# Altium footprint library ACTION标准库.pcblib: 504 footprints (part 25 of 32)
Each footprint in its own frame and in the unit in brackets; x right, y up, seen from the top. Pads: shape width x height; smd on the part's side, far side on the other; paste and mask are expansions set on the pad; w line width, h text height; cw(c..) or ccw(c..) is an arc to the next point about the centre after c.
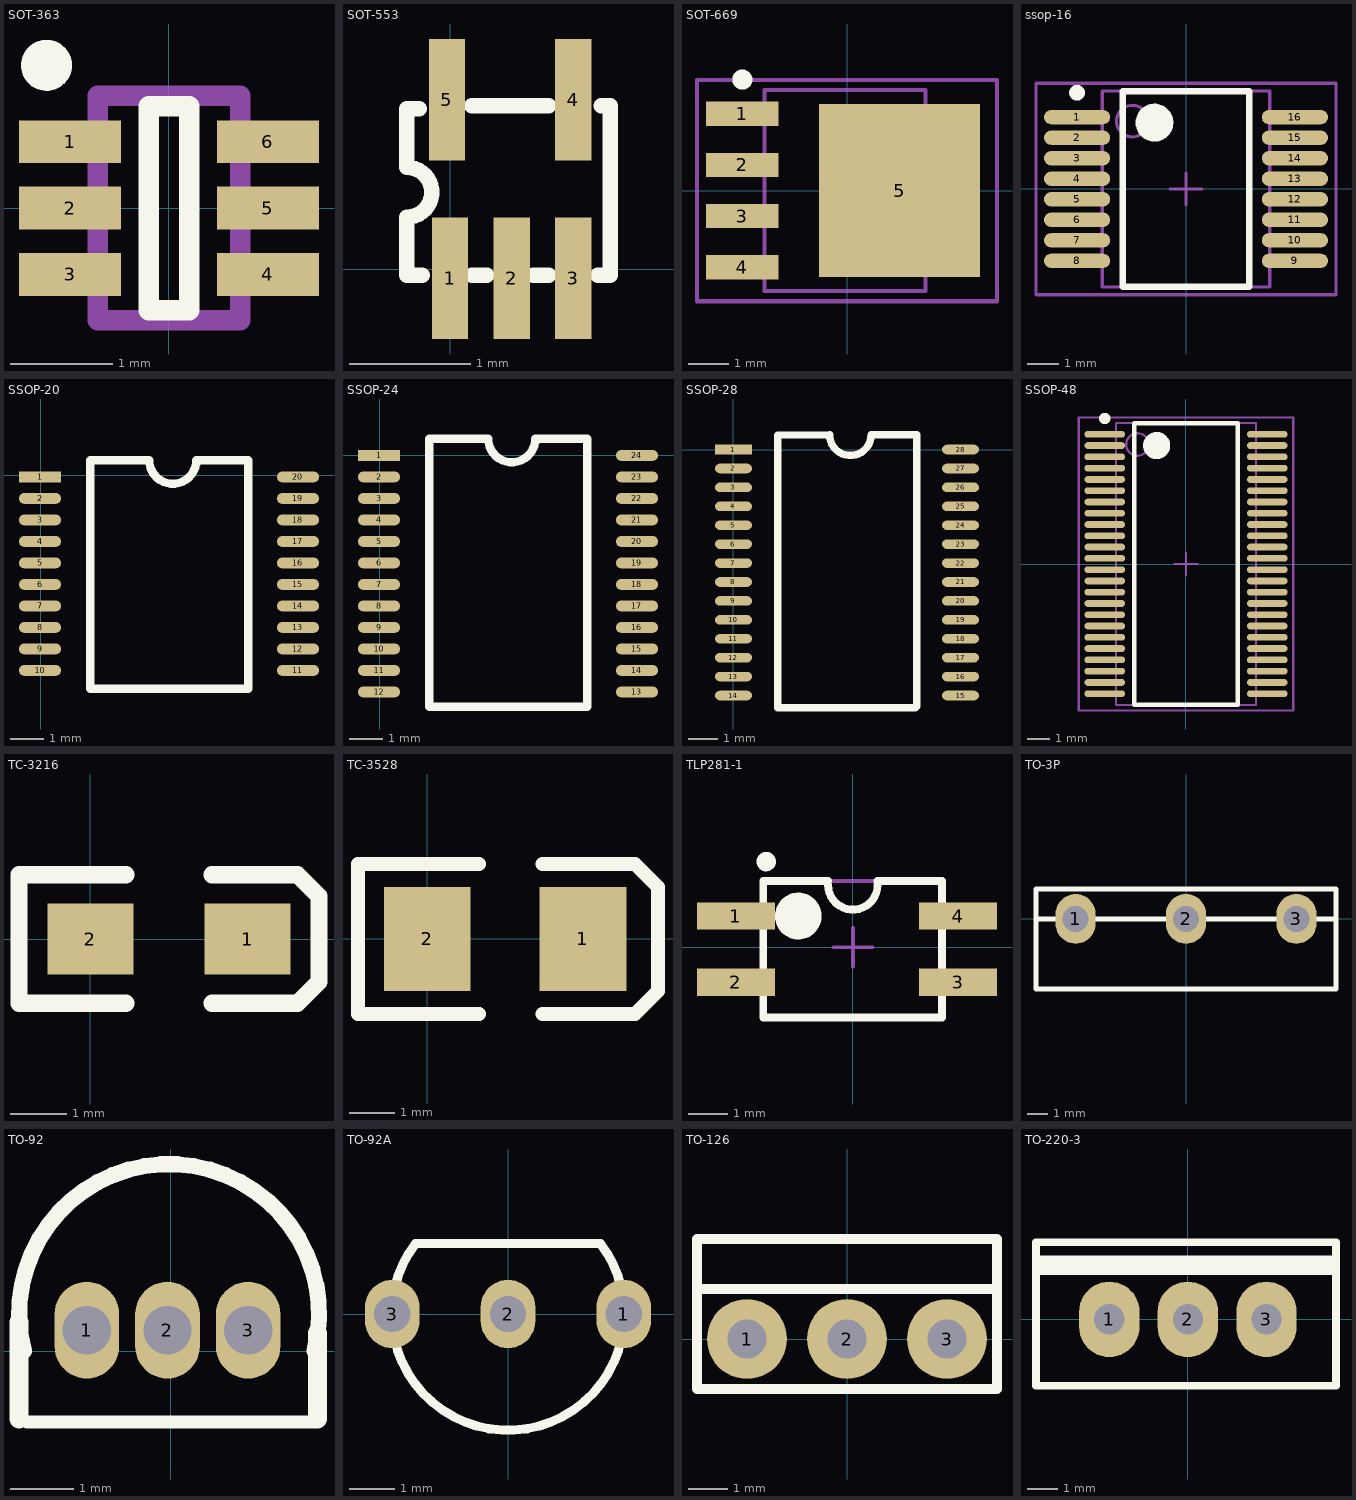
[diagram p24: the footprints below, top view; thin cyan lines are the x and y axes]

## SOT-363 [mm]
pads (6):
  rect 1x0.42 smd mask+0.051: 1(-0.97,0.65) 2(-0.97,0) 3(-0.97,-0.65) 4(0.97,-0.65) 5(0.97,0) 6(0.97,0.65)
Top Overlay:
  circle w0.25: c-1.2,1.4 r0.125
  lines w0.2: -0.2,-1 0.2,-1 0.2,1 -0.2,1 -0.2,-1
Mechanical 13:
  lines w0.2: -0.7,-1.1 -0.7,1.1 0.7,1.1 0.7,-1.1 -0.7,-1.1
3D body "User Library-SOT363-2.STEP": height 1.1, standoff 0, extent -1.2,-1.1 1.2,1.1

## SOT-553 [mm]
pads (5):
  rect 0.3x1 smd: 1(0,-0.076) 2(0.508,-0.076) 3(1.016,-0.076) 4(1.016,1.397) 5(-0.025,1.397)
Top Overlay:
  lines w0.127: -0.254,1.321 -0.356,1.321 -0.356,0.838 cw(c-0.356,0.633) -0.356,0.429 -0.356,-0.051 -0.229,-0.051 ; 0.178,-0.051 0.305,-0.051 ; 0.178,1.346 0.813,1.346 ; 0.686,-0.051 0.813,-0.051 ; 1.219,-0.051 1.321,-0.051 1.321,1.346 1.245,1.346
3D body "User Library-sot-553.STEP": height 0.48, standoff -0.02, extent -0.279,-0.013 1.321,1.587

## SOT-669 [mm] "TO, 5-Pads, Body 4.0x5.0mm (max), IPC Medium Density"
height 1
pads (5):
  rect 1.8x0.6 smd: 1(-2.6,1.905) 2(-2.6,0.635) 3(-2.6,-0.635) 4(-2.6,-1.905)
  rect 4x4.3 smd: 5(1.306,0)
Top Overlay:
  circle w0.25: c-2.6,2.755 r0.125
Mechanical 13:
  lines w0.1: -2.05,-2.5 1.95,-2.5 1.95,2.5 -2.05,2.5 -2.05,-2.5
Mechanical 15:
  lines w0.1: -0.5,0 0.5,0 ; 0,-0.5 0,0.5 ; -3.725,-2.75 3.725,-2.75 3.725,2.75 -3.725,2.75 -3.725,-2.75
3D body "User Library-SOT669.STEP": height 1.2, standoff 0, extent -3.214,-2.475 3.553,2.525

## ssop-16 [mm] "SOP, 16-Leads, Body 6.2x5.3mm (max), Pitch 0.65mm, IPC Medium Density"
height 1.86
pads (16):
  oval 2.1x0.45 smd: 1(-3.45,2.275) 2(-3.45,1.625) 3(-3.45,0.975) 4(-3.45,0.325) 5(-3.45,-0.325) 6(-3.45,-0.975) 7(-3.45,-1.625) 8(-3.45,-2.275) 9(3.45,-2.275) 10(3.45,-1.625) 11(3.45,-0.975) 12(3.45,-0.325) 13(3.45,0.325) 14(3.45,0.975) 15(3.45,1.625) 16(3.45,2.275)
Top Overlay:
  circle w0.6: c-1,2.1 r0.3
  circle w0.25: c-3.45,3.05 r0.125
  lines w0.2: -2,-3.1 2,-3.1 2,3.1 -2,3.1 -2,-3.1
Mechanical 13:
  circle w0.1: c-1.7,2.15 r0.5
  lines w0.1: -2.65,-3.1 2.65,-3.1 2.65,3.1 -2.65,3.1 -2.65,-3.1
Mechanical 15:
  lines w0.1: -0.5,0 0.5,0 ; 0,-0.5 0,0.5 ; -4.75,-3.35 4.75,-3.35 4.75,3.35 -4.75,3.35 -4.75,-3.35
3D body "SSOP-16.STEP": height 1.13, standoff 0.03, extent -2.972,-2.489 3.023,2.489

## SSOP-20 [mm]
pads (20):
  rect 1.27x0.33 smd: 1(-0.025,-0.051)
  oval 1.27x0.33 smd: 2(-0.025,-0.701) 3(-0.025,-1.351) 4(-0.025,-2.001) 5(-0.025,-2.651) 6(-0.025,-3.301) 7(-0.025,-3.951) 8(-0.025,-4.601) 9(-0.025,-5.251) 10(-0.025,-5.901) 11(7.775,-5.901) 12(7.775,-5.251) 13(7.775,-4.601) 14(7.775,-3.951) 15(7.775,-3.301) 16(7.775,-2.651) 17(7.775,-2.001) 18(7.775,-1.351) 19(7.775,-0.701) 20(7.775,-0.051)
Top Overlay:
  lines w0.254: 6.223,-6.45 1.499,-6.45 1.499,0.449 3.269,0.449 3.277,0.457 ccw(c3.99,0.457) 4.703,0.457 6.266,0.457 6.274,0.449 6.274,-6.45
3D body "SSOP-20.STEP": height 2.04, standoff 0.05, extent -0.013,-6.637 7.887,0.693

## SSOP-24 [mm]
pads (24):
  rect 1.27x0.33 smd: 1(-0.025,0)
  oval 1.27x0.33 smd: 2(-0.025,-0.65) 3(-0.025,-1.3) 4(-0.025,-1.95) 5(-0.025,-2.6) 6(-0.025,-3.25) 7(-0.025,-3.9) 8(-0.025,-4.55) 9(-0.025,-5.2) 10(-0.025,-5.85) 11(-0.025,-6.5) 12(-0.025,-7.15) 13(7.775,-7.15) 14(7.775,-6.5) 15(7.775,-5.85) 16(7.775,-5.2) 17(7.775,-4.55) 18(7.775,-3.9) 19(7.775,-3.25) 20(7.775,-2.6) 21(7.775,-1.95) 22(7.775,-1.3) 23(7.775,-0.65) 24(7.775,0)
Top Overlay:
  lines w0.254: 6.223,-7.6 1.499,-7.6 1.499,0.5 3.269,0.5 3.277,0.508 ccw(c3.99,0.508) 4.703,0.508 6.266,0.508 6.274,0.5 6.274,-7.6
3D body "User Library-SSOP-24.STEP": height 1.9, standoff 0, extent -0.141,-7.758 7.659,0.442

## SSOP-28 [mm]
pads (28):
  rect 1.27x0.33 smd: 1(0,0)
  oval 1.27x0.33 smd: 2(0,-0.65) 3(0,-1.3) 4(0,-1.95) 5(0,-2.6) 6(0,-3.25) 7(0,-3.9) 8(0,-4.55) 9(0,-5.2) 10(0,-5.85) 11(0,-6.5) 12(0,-7.15) 13(0,-7.8) 14(0,-8.45) 15(7.8,-8.45) 16(7.8,-7.8) 17(7.8,-7.15) 18(7.8,-6.5) 19(7.8,-5.85) 20(7.8,-5.2) 21(7.8,-4.55) 22(7.8,-3.9) 23(7.8,-3.25) 24(7.8,-2.6) 25(7.8,-1.95) 26(7.8,-1.3) 27(7.8,-0.65) 28(7.8,0)
Top Overlay:
  lines w0.254: 1.524,-8.865 1.524,0.5 3.294,0.5 3.302,0.508 ccw(c4.015,0.508) 4.728,0.508 6.291,0.508 6.299,0.5 6.299,-8.814 6.248,-8.865 1.524,-8.865
3D body "User Library-SSOP-28-3.STEP": height 1.9, standoff 0, extent 0.062,-9.342 7.862,0.858

## SSOP-48 [mm]
pads (48):
  oval 1.8x0.3 smd: 1(-3.6,5.75) 2(-3.6,5.25) 3(-3.6,4.75) 4(-3.6,4.25) 5(-3.6,3.75) 6(-3.6,3.25) 7(-3.6,2.75) 8(-3.6,2.25) 9(-3.6,1.75) 10(-3.6,1.25) 11(-3.6,0.75) 12(-3.6,0.25) 13(-3.6,-0.25) 14(-3.6,-0.75) 15(-3.6,-1.25) 16(-3.6,-1.75) 17(-3.6,-2.25) 18(-3.6,-2.75) 19(-3.6,-3.25) 20(-3.6,-3.75) 21(-3.6,-4.25) 22(-3.6,-4.75) 23(-3.6,-5.25) 24(-3.6,-5.75) 25(3.6,-5.75) 26(3.6,-5.25) 27(3.6,-4.75) 28(3.6,-4.25) 29(3.6,-3.75) 30(3.6,-3.25) 31(3.6,-2.75) 32(3.6,-2.25) 33(3.6,-1.75) 34(3.6,-1.25) 35(3.6,-0.75) 36(3.6,-0.25) 37(3.6,0.25) 38(3.6,0.75) 39(3.6,1.25) 40(3.6,1.75) 41(3.6,2.25) 42(3.6,2.75) 43(3.6,3.25) 44(3.6,3.75) 45(3.6,4.25) 46(3.6,4.75) 47(3.6,5.25) 48(3.6,5.75)
Top Overlay:
  circle w0.6: c-1.3,5.25 r0.3
  circle w0.25: c-3.6,6.45 r0.125
  lines w0.2: -2.3,-6.25 2.3,-6.25 2.3,6.25 -2.3,6.25 -2.3,-6.25
Mechanical 13:
  circle w0.1: c-2.15,5.3 r0.5
  lines w0.1: -3.1,-6.25 3.1,-6.25 3.1,6.25 -3.1,6.25 -3.1,-6.25
Mechanical 15:
  lines w0.1: -0.5,0 0.5,0 ; 0,-0.5 0,0.5 ; -4.75,-6.5 4.75,-6.5 4.75,6.5 -4.75,6.5 -4.75,-6.5
3D body: height 1.2, standoff 0.15, extent -3.1,-6.25 3.1,6.25

## TC-3216 [mil]
pads (2):
  rect 60x50 smd: 1(110,0) 2(0,0)
Top Overlay:
  lines w12: 25,-45 -50,-45 -50,45 25,45 ; 85,-45 145,-45 160,-30 160,30 145,45 85,45
3D body "STEC_A.step": height 63.39, standoff 0, extent -17.81,-33.5 107.81,29.5

## TC-3528 [mil]
pads (2):
  rect 75x90 smd: 1(135,0) 2(0,0)
Top Overlay:
  lines w12: 45,-65 -60,-65 -60,65 45,65 ; 100,-65 180,-65 200,-45 200,45 180,65 100,65
3D body "STEC_C.step": height 98.82, standoff 0, extent -53.99,-63.98 181.99,62

## TLP281-1 [mm]
pads (4):
  rect 2x0.7 smd: 1(-3,0.8) 2(-3,-0.9) 3(2.7,-0.9) 4(2.7,0.8)
Top Overlay:
  circle w0.25: c-2.225,2.2 r0.125
  circle w0.6: c-1.4,0.8 r0.3
  lines w0.2: -0.635,1.6 ccw(c0,1.6) 0.635,1.6 ; -0.635,1.7 -2.3,1.7 -2.3,-1.8 2.286,-1.8 2.286,-1.673 2.286,1.7 0.635,1.7
Mechanical 13:
  circle w0.1: c-1.4,0.8 r0.5
  lines w0.1: -2.3,-1.8 -2.3,1.7 2.3,1.7 2.3,-1.8 -2.3,-1.8
Mechanical 15:
  lines w0.1: -0.5,0 0.5,0 ; 0,-0.5 0,0.5
3D body: height 2, standoff 0, extent -2.3,-1.8 2.322,1.7

## TO-3P [mil]
pads (3):
  oval 79x98 hole 51: 1(-217,0) 2(0,0) 3(217,0)
Top Overlay:
  lines w10: -295,0 295,0 ; -295,-138 295,-138 295,59 -295,59 -295,-138

## TO-92 [mil]
pads (3):
  oval 40x60 hole 30: 1(-52,13) 2(-2,13) 3(48,13)
Top Overlay:
  lines w8: -89,-44 91,-44
  lines w10: -91,0 cw(c-1,23) 89,0
  lines w12: -94,-42 -94,18 ; 91,-42 91,11
3D body "TO-92A.STEP": height 314.96, standoff -118.11, extent -95.49,-51 93.49,103.73

## TO-92A [mm]
height 15.62
pads (3):
  oval 1.2x1.5 hole 0.8: 1(2.54,0) 2(0,0) 3(-2.54,0)
Top Overlay:
  lines w0.2: 0,-0.225 0,0.225 ; 0,0 -0.248,0 0.322,0 ; -2.025,1.55 ccw(c0,0) 2.025,1.55 -2.025,1.55
3D body "TO-92A.step": height 9.7, standoff -1.6, extent -2.76,-2.54 2.77,1.538

## TO-126 [mil]
pads (3):
  round 80 hole 39: 1(-100,0) 2(0,0) 3(100,0)
Top Overlay:
  lines w10: 150,40 150,100 -150,100 -150,50 ; -150,50 -150,-50 150,-50 150,50 -150,50
3D body "TO-126.STEP": height 560.6, standoff -533.89, extent -156.48,-78 158.48,49.96

## TO-220-3 [mm]
pads (3):
  oval 2x2.5 hole 1: 1(-2.6,0) 2(0,0) 3(2.6,0)
Top Overlay:
  rectangle: -5.025,1.47 4.9,2.118
  lines w0.254: -5.025,-2.2 4.9,-2.2 4.9,2.55 -5.025,2.55 -5.025,-2.2
3D body "TO-220A.step": height 19.3, standoff -9.08, extent -4.956,-2.33 4.696,2.17